# Altium schematic symbol library jlcpcb_2025_04_resistors_extended_1210.schlib: 2670 symbols (part 5 of 14) (continued)
## AC1210FR-07220RL
designator R?  Resistance: 220Ω  (hidden comment: *)
Resistor, 220Ω, ±1%, 500mW, 200V, ±100ppm/℃, -55℃~+155℃, SMD 1210; Manufacturer: Uniroyal; Manufacturer Part Number: AC1210FR-07220RL; Supplier 1: LCSC; Supplier Part Number 1: C230115; JLCPCB Part Number: C230115; Power Rating: 500mW; Category: Resistors; Package Size: 1210; JLCPCB Basic Part: Yes; Tolerance: ±1%; Voltage Rating: 200V; Temperature Coefficient: ±100ppm/℃; Temperature Rating: -55℃~+155℃; ComponentLink1Description: Datasheet; ComponentLink1URL: https://wmsc.lcsc.com/wmsc/upload/file/pdf/v2/lcsc/2304140030_YAGEO-AC1210FR-07220RL_C230115.pdf; ComponentLink2Description: JLCPCB Part URL; ComponentLink2URL: https://jlcpcb.com/partdetail/C230115
pins: 1, 2
1 alternate drawing of the same symbol

## AC1210FR-07221RL
designator R?  Resistance: 221Ω  (hidden comment: *)
Resistor, 221Ω, ±1%, 500mW, 200V, ±100ppm/℃, -55℃~+155℃, SMD 1210; Manufacturer: Uniroyal; Manufacturer Part Number: AC1210FR-07221RL; Supplier 1: LCSC; Supplier Part Number 1: C230116; JLCPCB Part Number: C230116; Power Rating: 500mW; Category: Resistors; Package Size: 1210; JLCPCB Basic Part: Yes; Tolerance: ±1%; Voltage Rating: 200V; Temperature Coefficient: ±100ppm/℃; Temperature Rating: -55℃~+155℃; ComponentLink1Description: Datasheet; ComponentLink1URL: https://wmsc.lcsc.com/wmsc/upload/file/pdf/v2/lcsc/2304140030_YAGEO-AC1210FR-07221RL_C230116.pdf; ComponentLink2Description: JLCPCB Part URL; ComponentLink2URL: https://jlcpcb.com/partdetail/C230116
pins: 1, 2
1 alternate drawing of the same symbol

## AC1210FR-07226RL
designator R?  Resistance: 226Ω  (hidden comment: *)
Resistor, 226Ω, ±1%, 500mW, 200V, ±100ppm/℃, -55℃~+155℃, SMD 1210; Manufacturer: Uniroyal; Manufacturer Part Number: AC1210FR-07226RL; Supplier 1: LCSC; Supplier Part Number 1: C230117; JLCPCB Part Number: C230117; Power Rating: 500mW; Category: Resistors; Package Size: 1210; JLCPCB Basic Part: Yes; Tolerance: ±1%; Voltage Rating: 200V; Temperature Coefficient: ±100ppm/℃; Temperature Rating: -55℃~+155℃; ComponentLink1Description: Datasheet; ComponentLink1URL: https://wmsc.lcsc.com/wmsc/upload/file/pdf/v2/lcsc/2304140030_YAGEO-AC1210FR-07226RL_C230117.pdf; ComponentLink2Description: JLCPCB Part URL; ComponentLink2URL: https://jlcpcb.com/partdetail/C230117
pins: 1, 2
1 alternate drawing of the same symbol

## AC1210FR-07232RL
designator R?  Resistance: 232Ω  (hidden comment: *)
Resistor, 232Ω, ±1%, 500mW, 200V, ±100ppm/℃, -55℃~+155℃, SMD 1210; Manufacturer: Uniroyal; Manufacturer Part Number: AC1210FR-07232RL; Supplier 1: LCSC; Supplier Part Number 1: C230122; JLCPCB Part Number: C230122; Power Rating: 500mW; Category: Resistors; Package Size: 1210; JLCPCB Basic Part: Yes; Tolerance: ±1%; Voltage Rating: 200V; Temperature Coefficient: ±100ppm/℃; Temperature Rating: -55℃~+155℃; ComponentLink1Description: Datasheet; ComponentLink1URL: https://wmsc.lcsc.com/wmsc/upload/file/pdf/v2/lcsc/2304140030_YAGEO-AC1210FR-07232RL_C230122.pdf; ComponentLink2Description: JLCPCB Part URL; ComponentLink2URL: https://jlcpcb.com/partdetail/C230122
pins: 1, 2
1 alternate drawing of the same symbol

## AC1210FR-07237RL
designator R?  Resistance: 237Ω  (hidden comment: *)
Resistor, 237Ω, ±1%, 500mW, 200V, ±100ppm/℃, -55℃~+155℃, SMD 1210; Manufacturer: Uniroyal; Manufacturer Part Number: AC1210FR-07237RL; Supplier 1: LCSC; Supplier Part Number 1: C230123; JLCPCB Part Number: C230123; Power Rating: 500mW; Category: Resistors; Package Size: 1210; JLCPCB Basic Part: Yes; Tolerance: ±1%; Voltage Rating: 200V; Temperature Coefficient: ±100ppm/℃; Temperature Rating: -55℃~+155℃; ComponentLink1Description: Datasheet; ComponentLink1URL: https://wmsc.lcsc.com/wmsc/upload/file/pdf/v2/lcsc/2304140030_YAGEO-AC1210FR-07237RL_C230123.pdf; ComponentLink2Description: JLCPCB Part URL; ComponentLink2URL: https://jlcpcb.com/partdetail/C230123
pins: 1, 2
1 alternate drawing of the same symbol

## AC1210FR-07240KL
designator R?  Resistance: 240kΩ  (hidden comment: *)
Resistor, 240kΩ, ±1%, 500mW, 200V, ±100ppm/℃, -55℃~+155℃, SMD 1210; Manufacturer: Uniroyal; Manufacturer Part Number: AC1210FR-07240KL; Supplier 1: LCSC; Supplier Part Number 1: C230127; JLCPCB Part Number: C230127; Power Rating: 500mW; Category: Resistors; Package Size: 1210; JLCPCB Basic Part: Yes; Tolerance: ±1%; Voltage Rating: 200V; Temperature Coefficient: ±100ppm/℃; Temperature Rating: -55℃~+155℃; ComponentLink1Description: Datasheet; ComponentLink1URL: https://wmsc.lcsc.com/wmsc/upload/file/pdf/v2/lcsc/2304140030_YAGEO-AC1210FR-07240KL_C230127.pdf; ComponentLink2Description: JLCPCB Part URL; ComponentLink2URL: https://jlcpcb.com/partdetail/C230127
pins: 1, 2
1 alternate drawing of the same symbol

## AC1210FR-07240RL
designator R?  Resistance: 240Ω  (hidden comment: *)
Resistor, 240Ω, ±1%, 500mW, 200V, ±100ppm/℃, -55℃~+155℃, SMD 1210; Manufacturer: Uniroyal; Manufacturer Part Number: AC1210FR-07240RL; Supplier 1: LCSC; Supplier Part Number 1: C230128; JLCPCB Part Number: C230128; Power Rating: 500mW; Category: Resistors; Package Size: 1210; JLCPCB Basic Part: Yes; Tolerance: ±1%; Voltage Rating: 200V; Temperature Coefficient: ±100ppm/℃; Temperature Rating: -55℃~+155℃; ComponentLink1Description: Datasheet; ComponentLink1URL: https://wmsc.lcsc.com/wmsc/upload/file/pdf/v2/lcsc/2304140030_YAGEO-AC1210FR-07240RL_C230128.pdf; ComponentLink2Description: JLCPCB Part URL; ComponentLink2URL: https://jlcpcb.com/partdetail/C230128
pins: 1, 2
1 alternate drawing of the same symbol

## AC1210FR-07243RL
designator R?  Resistance: 243Ω  (hidden comment: *)
Resistor, 243Ω, ±1%, 500mW, 200V, ±100ppm/℃, -55℃~+155℃, SMD 1210; Manufacturer: Uniroyal; Manufacturer Part Number: AC1210FR-07243RL; Supplier 1: LCSC; Supplier Part Number 1: C230129; JLCPCB Part Number: C230129; Power Rating: 500mW; Category: Resistors; Package Size: 1210; JLCPCB Basic Part: Yes; Tolerance: ±1%; Voltage Rating: 200V; Temperature Coefficient: ±100ppm/℃; Temperature Rating: -55℃~+155℃; ComponentLink1Description: Datasheet; ComponentLink1URL: https://wmsc.lcsc.com/wmsc/upload/file/pdf/v2/lcsc/2304140030_YAGEO-AC1210FR-07243RL_C230129.pdf; ComponentLink2Description: JLCPCB Part URL; ComponentLink2URL: https://jlcpcb.com/partdetail/C230129
pins: 1, 2
1 alternate drawing of the same symbol

## AC1210FR-07255RL
designator R?  Resistance: 255Ω  (hidden comment: *)
Resistor, 255Ω, ±1%, 500mW, 200V, ±100ppm/℃, -55℃~+155℃, SMD 1210; Manufacturer: Uniroyal; Manufacturer Part Number: AC1210FR-07255RL; Supplier 1: LCSC; Supplier Part Number 1: C230137; JLCPCB Part Number: C230137; Power Rating: 500mW; Category: Resistors; Package Size: 1210; JLCPCB Basic Part: Yes; Tolerance: ±1%; Voltage Rating: 200V; Temperature Coefficient: ±100ppm/℃; Temperature Rating: -55℃~+155℃; ComponentLink1Description: Datasheet; ComponentLink1URL: https://wmsc.lcsc.com/wmsc/upload/file/pdf/v2/lcsc/2304140030_YAGEO-AC1210FR-07255RL_C230137.pdf; ComponentLink2Description: JLCPCB Part URL; ComponentLink2URL: https://jlcpcb.com/partdetail/C230137
pins: 1, 2
1 alternate drawing of the same symbol

## AC1210FR-07267KL
designator R?  Resistance: 267kΩ  (hidden comment: *)
Resistor, 267kΩ, ±1%, 500mW, 200V, ±100ppm/℃, -55℃~+155℃, SMD 1210; Manufacturer: Uniroyal; Manufacturer Part Number: AC1210FR-07267KL; Supplier 1: LCSC; Supplier Part Number 1: C230139; JLCPCB Part Number: C230139; Power Rating: 500mW; Category: Resistors; Package Size: 1210; JLCPCB Basic Part: Yes; Tolerance: ±1%; Voltage Rating: 200V; Temperature Coefficient: ±100ppm/℃; Temperature Rating: -55℃~+155℃; ComponentLink1Description: Datasheet; ComponentLink1URL: https://wmsc.lcsc.com/wmsc/upload/file/pdf/v2/lcsc/2304140030_YAGEO-AC1210FR-07267KL_C230139.pdf; ComponentLink2Description: JLCPCB Part URL; ComponentLink2URL: https://jlcpcb.com/partdetail/C230139
pins: 1, 2
1 alternate drawing of the same symbol

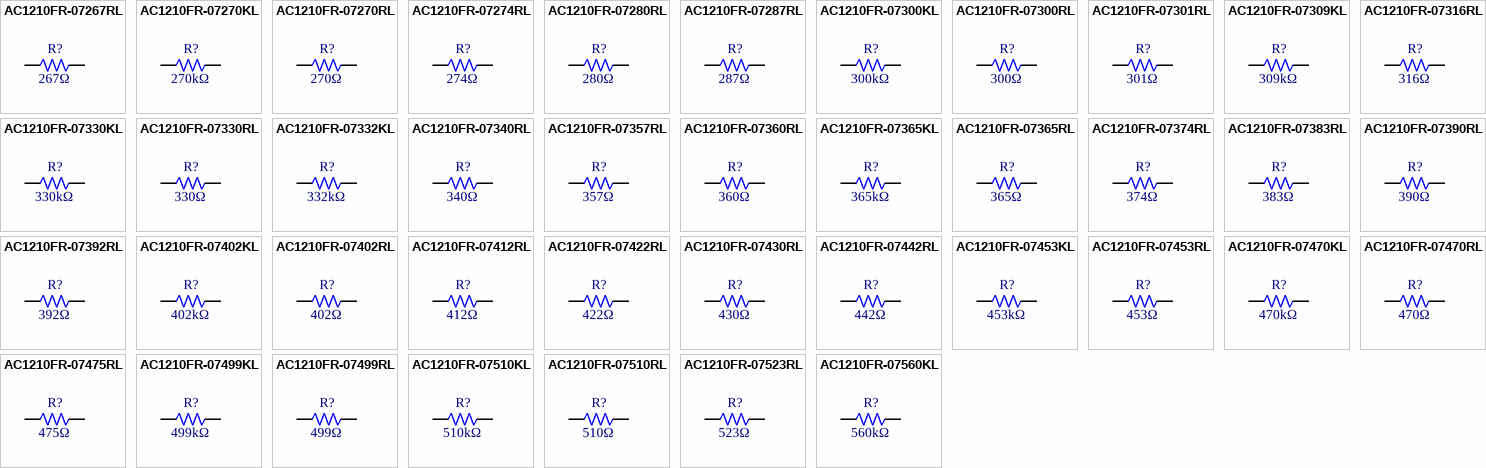
[diagram p22: symbols AC1210FR-07267RL to AC1210FR-07560KL]

## AC1210FR-07267RL
designator R?  Resistance: 267Ω  (hidden comment: *)
Resistor, 267Ω, ±1%, 500mW, 200V, ±100ppm/℃, -55℃~+155℃, SMD 1210; Manufacturer: Uniroyal; Manufacturer Part Number: AC1210FR-07267RL; Supplier 1: LCSC; Supplier Part Number 1: C230140; JLCPCB Part Number: C230140; Power Rating: 500mW; Category: Resistors; Package Size: 1210; JLCPCB Basic Part: Yes; Tolerance: ±1%; Voltage Rating: 200V; Temperature Coefficient: ±100ppm/℃; Temperature Rating: -55℃~+155℃; ComponentLink1Description: Datasheet; ComponentLink1URL: https://wmsc.lcsc.com/wmsc/upload/file/pdf/v2/lcsc/2304140030_YAGEO-AC1210FR-07267RL_C230140.pdf; ComponentLink2Description: JLCPCB Part URL; ComponentLink2URL: https://jlcpcb.com/partdetail/C230140
pins: 1, 2
1 alternate drawing of the same symbol

## AC1210FR-07270KL
designator R?  Resistance: 270kΩ  (hidden comment: *)
Resistor, 270kΩ, ±1%, 500mW, 200V, ±100ppm/℃, -55℃~+155℃, SMD 1210; Manufacturer: Uniroyal; Manufacturer Part Number: AC1210FR-07270KL; Supplier 1: LCSC; Supplier Part Number 1: C230143; JLCPCB Part Number: C230143; Power Rating: 500mW; Category: Resistors; Package Size: 1210; JLCPCB Basic Part: Yes; Tolerance: ±1%; Voltage Rating: 200V; Temperature Coefficient: ±100ppm/℃; Temperature Rating: -55℃~+155℃; ComponentLink1Description: Datasheet; ComponentLink1URL: https://wmsc.lcsc.com/wmsc/upload/file/pdf/v2/lcsc/2304140030_YAGEO-AC1210FR-07270KL_C230143.pdf; ComponentLink2Description: JLCPCB Part URL; ComponentLink2URL: https://jlcpcb.com/partdetail/C230143
pins: 1, 2
1 alternate drawing of the same symbol

## AC1210FR-07270RL
designator R?  Resistance: 270Ω  (hidden comment: *)
Resistor, 270Ω, ±1%, 500mW, 200V, ±100ppm/℃, -55℃~+155℃, SMD 1210; Manufacturer: Uniroyal; Manufacturer Part Number: AC1210FR-07270RL; Supplier 1: LCSC; Supplier Part Number 1: C230144; JLCPCB Part Number: C230144; Power Rating: 500mW; Category: Resistors; Package Size: 1210; JLCPCB Basic Part: Yes; Tolerance: ±1%; Voltage Rating: 200V; Temperature Coefficient: ±100ppm/℃; Temperature Rating: -55℃~+155℃; ComponentLink1Description: Datasheet; ComponentLink1URL: https://wmsc.lcsc.com/wmsc/upload/file/pdf/v2/lcsc/2304140030_YAGEO-AC1210FR-07270RL_C230144.pdf; ComponentLink2Description: JLCPCB Part URL; ComponentLink2URL: https://jlcpcb.com/partdetail/C230144
pins: 1, 2
1 alternate drawing of the same symbol

## AC1210FR-07274RL
designator R?  Resistance: 274Ω  (hidden comment: *)
Resistor, 274Ω, ±1%, 500mW, 200V, ±100ppm/℃, -55℃~+155℃, SMD 1210; Manufacturer: Uniroyal; Manufacturer Part Number: AC1210FR-07274RL; Supplier 1: LCSC; Supplier Part Number 1: C230145; JLCPCB Part Number: C230145; Power Rating: 500mW; Category: Resistors; Package Size: 1210; JLCPCB Basic Part: Yes; Tolerance: ±1%; Voltage Rating: 200V; Temperature Coefficient: ±100ppm/℃; Temperature Rating: -55℃~+155℃; ComponentLink1Description: Datasheet; ComponentLink1URL: https://wmsc.lcsc.com/wmsc/upload/file/pdf/v2/lcsc/2304140030_YAGEO-AC1210FR-07274RL_C230145.pdf; ComponentLink2Description: JLCPCB Part URL; ComponentLink2URL: https://jlcpcb.com/partdetail/C230145
pins: 1, 2
1 alternate drawing of the same symbol

## AC1210FR-07280RL
designator R?  Resistance: 280Ω  (hidden comment: *)
Resistor, 280Ω, ±1%, 500mW, 200V, ±100ppm/℃, -55℃~+155℃, SMD 1210; Manufacturer: Uniroyal; Manufacturer Part Number: AC1210FR-07280RL; Supplier 1: LCSC; Supplier Part Number 1: C230150; JLCPCB Part Number: C230150; Power Rating: 500mW; Category: Resistors; Package Size: 1210; JLCPCB Basic Part: Yes; Tolerance: ±1%; Voltage Rating: 200V; Temperature Coefficient: ±100ppm/℃; Temperature Rating: -55℃~+155℃; ComponentLink1Description: Datasheet; ComponentLink1URL: https://wmsc.lcsc.com/wmsc/upload/file/pdf/v2/lcsc/2304140030_YAGEO-AC1210FR-07280RL_C230150.pdf; ComponentLink2Description: JLCPCB Part URL; ComponentLink2URL: https://jlcpcb.com/partdetail/C230150
pins: 1, 2
1 alternate drawing of the same symbol

## AC1210FR-07287RL
designator R?  Resistance: 287Ω  (hidden comment: *)
Resistor, 287Ω, ±1%, 500mW, 200V, ±100ppm/℃, -55℃~+155℃, SMD 1210; Manufacturer: Uniroyal; Manufacturer Part Number: AC1210FR-07287RL; Supplier 1: LCSC; Supplier Part Number 1: C230151; JLCPCB Part Number: C230151; Power Rating: 500mW; Category: Resistors; Package Size: 1210; JLCPCB Basic Part: Yes; Tolerance: ±1%; Voltage Rating: 200V; Temperature Coefficient: ±100ppm/℃; Temperature Rating: -55℃~+155℃; ComponentLink1Description: Datasheet; ComponentLink1URL: https://wmsc.lcsc.com/wmsc/upload/file/pdf/v2/lcsc/2304140030_YAGEO-AC1210FR-07287RL_C230151.pdf; ComponentLink2Description: JLCPCB Part URL; ComponentLink2URL: https://jlcpcb.com/partdetail/C230151
pins: 1, 2
1 alternate drawing of the same symbol

## AC1210FR-07300KL
designator R?  Resistance: 300kΩ  (hidden comment: *)
Resistor, 300kΩ, ±1%, 500mW, 200V, ±100ppm/℃, -55℃~+155℃, SMD 1210; Manufacturer: Uniroyal; Manufacturer Part Number: AC1210FR-07300KL; Supplier 1: LCSC; Supplier Part Number 1: C230178; JLCPCB Part Number: C230178; Power Rating: 500mW; Category: Resistors; Package Size: 1210; JLCPCB Basic Part: Yes; Tolerance: ±1%; Voltage Rating: 200V; Temperature Coefficient: ±100ppm/℃; Temperature Rating: -55℃~+155℃; ComponentLink1Description: Datasheet; ComponentLink1URL: https://wmsc.lcsc.com/wmsc/upload/file/pdf/v2/lcsc/2304140030_YAGEO-AC1210FR-07300KL_C230178.pdf; ComponentLink2Description: JLCPCB Part URL; ComponentLink2URL: https://jlcpcb.com/partdetail/C230178
pins: 1, 2
1 alternate drawing of the same symbol

## AC1210FR-07300RL
designator R?  Resistance: 300Ω  (hidden comment: *)
Resistor, 300Ω, ±1%, 500mW, 200V, ±100ppm/℃, -55℃~+155℃, SMD 1210; Manufacturer: Uniroyal; Manufacturer Part Number: AC1210FR-07300RL; Supplier 1: LCSC; Supplier Part Number 1: C230179; JLCPCB Part Number: C230179; Power Rating: 500mW; Category: Resistors; Package Size: 1210; JLCPCB Basic Part: Yes; Tolerance: ±1%; Voltage Rating: 200V; Temperature Coefficient: ±100ppm/℃; Temperature Rating: -55℃~+155℃; ComponentLink1Description: Datasheet; ComponentLink1URL: https://wmsc.lcsc.com/wmsc/upload/file/pdf/v2/lcsc/2304140030_YAGEO-AC1210FR-07300RL_C230179.pdf; ComponentLink2Description: JLCPCB Part URL; ComponentLink2URL: https://jlcpcb.com/partdetail/C230179
pins: 1, 2
1 alternate drawing of the same symbol

## AC1210FR-07301RL
designator R?  Resistance: 301Ω  (hidden comment: *)
Resistor, 301Ω, ±1%, 500mW, 200V, ±100ppm/℃, -55℃~+155℃, SMD 1210; Manufacturer: Uniroyal; Manufacturer Part Number: AC1210FR-07301RL; Supplier 1: LCSC; Supplier Part Number 1: C230180; JLCPCB Part Number: C230180; Power Rating: 500mW; Category: Resistors; Package Size: 1210; JLCPCB Basic Part: Yes; Tolerance: ±1%; Voltage Rating: 200V; Temperature Coefficient: ±100ppm/℃; Temperature Rating: -55℃~+155℃; ComponentLink1Description: Datasheet; ComponentLink1URL: https://wmsc.lcsc.com/wmsc/upload/file/pdf/v2/lcsc/2304140030_YAGEO-AC1210FR-07301RL_C230180.pdf; ComponentLink2Description: JLCPCB Part URL; ComponentLink2URL: https://jlcpcb.com/partdetail/C230180
pins: 1, 2
1 alternate drawing of the same symbol

## AC1210FR-07309KL
designator R?  Resistance: 309kΩ  (hidden comment: *)
Resistor, 309kΩ, ±1%, 500mW, 200V, ±100ppm/℃, -55℃~+155℃, SMD 1210; Manufacturer: Uniroyal; Manufacturer Part Number: AC1210FR-07309KL; Supplier 1: LCSC; Supplier Part Number 1: C230181; JLCPCB Part Number: C230181; Power Rating: 500mW; Category: Resistors; Package Size: 1210; JLCPCB Basic Part: Yes; Tolerance: ±1%; Voltage Rating: 200V; Temperature Coefficient: ±100ppm/℃; Temperature Rating: -55℃~+155℃; ComponentLink1Description: Datasheet; ComponentLink1URL: https://wmsc.lcsc.com/wmsc/upload/file/pdf/v2/lcsc/2304140030_YAGEO-AC1210FR-07309KL_C230181.pdf; ComponentLink2Description: JLCPCB Part URL; ComponentLink2URL: https://jlcpcb.com/partdetail/C230181
pins: 1, 2
1 alternate drawing of the same symbol

## AC1210FR-07316RL
designator R?  Resistance: 316Ω  (hidden comment: *)
Resistor, 316Ω, ±1%, 500mW, 200V, ±100ppm/℃, -55℃~+155℃, SMD 1210; Manufacturer: Uniroyal; Manufacturer Part Number: AC1210FR-07316RL; Supplier 1: LCSC; Supplier Part Number 1: C230187; JLCPCB Part Number: C230187; Power Rating: 500mW; Category: Resistors; Package Size: 1210; JLCPCB Basic Part: Yes; Tolerance: ±1%; Voltage Rating: 200V; Temperature Coefficient: ±100ppm/℃; Temperature Rating: -55℃~+155℃; ComponentLink1Description: Datasheet; ComponentLink1URL: https://wmsc.lcsc.com/wmsc/upload/file/pdf/v2/lcsc/2304140030_YAGEO-AC1210FR-07316RL_C230187.pdf; ComponentLink2Description: JLCPCB Part URL; ComponentLink2URL: https://jlcpcb.com/partdetail/C230187
pins: 1, 2
1 alternate drawing of the same symbol

## AC1210FR-07330KL
designator R?  Resistance: 330kΩ  (hidden comment: *)
Resistor, 330kΩ, ±1%, 500mW, 200V, ±100ppm/℃, -55℃~+155℃, SMD 1210; Manufacturer: Uniroyal; Manufacturer Part Number: AC1210FR-07330KL; Supplier 1: LCSC; Supplier Part Number 1: C230192; JLCPCB Part Number: C230192; Power Rating: 500mW; Category: Resistors; Package Size: 1210; JLCPCB Basic Part: Yes; Tolerance: ±1%; Voltage Rating: 200V; Temperature Coefficient: ±100ppm/℃; Temperature Rating: -55℃~+155℃; ComponentLink1Description: Datasheet; ComponentLink1URL: https://wmsc.lcsc.com/wmsc/upload/file/pdf/v2/lcsc/2304140030_YAGEO-AC1210FR-07330KL_C230192.pdf; ComponentLink2Description: JLCPCB Part URL; ComponentLink2URL: https://jlcpcb.com/partdetail/C230192
pins: 1, 2
1 alternate drawing of the same symbol

## AC1210FR-07330RL
designator R?  Resistance: 330Ω  (hidden comment: *)
Resistor, 330Ω, ±1%, 500mW, 200V, ±100ppm/℃, -55℃~+155℃, SMD 1210; Manufacturer: Uniroyal; Manufacturer Part Number: AC1210FR-07330RL; Supplier 1: LCSC; Supplier Part Number 1: C230193; JLCPCB Part Number: C230193; Power Rating: 500mW; Category: Resistors; Package Size: 1210; JLCPCB Basic Part: Yes; Tolerance: ±1%; Voltage Rating: 200V; Temperature Coefficient: ±100ppm/℃; Temperature Rating: -55℃~+155℃; ComponentLink1Description: Datasheet; ComponentLink1URL: https://wmsc.lcsc.com/wmsc/upload/file/pdf/v2/lcsc/2304140030_YAGEO-AC1210FR-07330RL_C230193.pdf; ComponentLink2Description: JLCPCB Part URL; ComponentLink2URL: https://jlcpcb.com/partdetail/C230193
pins: 1, 2
1 alternate drawing of the same symbol

## AC1210FR-07332KL
designator R?  Resistance: 332kΩ  (hidden comment: *)
Resistor, 332kΩ, ±1%, 500mW, 200V, ±100ppm/℃, -55℃~+155℃, SMD 1210; Manufacturer: Uniroyal; Manufacturer Part Number: AC1210FR-07332KL; Supplier 1: LCSC; Supplier Part Number 1: C230194; JLCPCB Part Number: C230194; Power Rating: 500mW; Category: Resistors; Package Size: 1210; JLCPCB Basic Part: Yes; Tolerance: ±1%; Voltage Rating: 200V; Temperature Coefficient: ±100ppm/℃; Temperature Rating: -55℃~+155℃; ComponentLink1Description: Datasheet; ComponentLink1URL: https://wmsc.lcsc.com/wmsc/upload/file/pdf/v2/lcsc/2304140030_YAGEO-AC1210FR-07332KL_C230194.pdf; ComponentLink2Description: JLCPCB Part URL; ComponentLink2URL: https://jlcpcb.com/partdetail/C230194
pins: 1, 2
1 alternate drawing of the same symbol

## AC1210FR-07340RL
designator R?  Resistance: 340Ω  (hidden comment: *)
Resistor, 340Ω, ±1%, 500mW, 200V, ±100ppm/℃, -55℃~+155℃, SMD 1210; Manufacturer: Uniroyal; Manufacturer Part Number: AC1210FR-07340RL; Supplier 1: LCSC; Supplier Part Number 1: C230199; JLCPCB Part Number: C230199; Power Rating: 500mW; Category: Resistors; Package Size: 1210; JLCPCB Basic Part: Yes; Tolerance: ±1%; Voltage Rating: 200V; Temperature Coefficient: ±100ppm/℃; Temperature Rating: -55℃~+155℃; ComponentLink1Description: Datasheet; ComponentLink1URL: https://wmsc.lcsc.com/wmsc/upload/file/pdf/v2/lcsc/2304140030_YAGEO-AC1210FR-07340RL_C230199.pdf; ComponentLink2Description: JLCPCB Part URL; ComponentLink2URL: https://jlcpcb.com/partdetail/C230199
pins: 1, 2
1 alternate drawing of the same symbol

## AC1210FR-07357RL
designator R?  Resistance: 357Ω  (hidden comment: *)
Resistor, 357Ω, ±1%, 500mW, 200V, ±100ppm/℃, -55℃~+155℃, SMD 1210; Manufacturer: Uniroyal; Manufacturer Part Number: AC1210FR-07357RL; Supplier 1: LCSC; Supplier Part Number 1: C230205; JLCPCB Part Number: C230205; Power Rating: 500mW; Category: Resistors; Package Size: 1210; JLCPCB Basic Part: Yes; Tolerance: ±1%; Voltage Rating: 200V; Temperature Coefficient: ±100ppm/℃; Temperature Rating: -55℃~+155℃; ComponentLink1Description: Datasheet; ComponentLink1URL: https://wmsc.lcsc.com/wmsc/upload/file/pdf/v2/lcsc/2304140030_YAGEO-AC1210FR-07357RL_C230205.pdf; ComponentLink2Description: JLCPCB Part URL; ComponentLink2URL: https://jlcpcb.com/partdetail/C230205
pins: 1, 2
1 alternate drawing of the same symbol

## AC1210FR-07360RL
designator R?  Resistance: 360Ω  (hidden comment: *)
Resistor, 360Ω, ±1%, 500mW, 200V, ±100ppm/℃, -55℃~+155℃, SMD 1210; Manufacturer: Uniroyal; Manufacturer Part Number: AC1210FR-07360RL; Supplier 1: LCSC; Supplier Part Number 1: C230208; JLCPCB Part Number: C230208; Power Rating: 500mW; Category: Resistors; Package Size: 1210; JLCPCB Basic Part: Yes; Tolerance: ±1%; Voltage Rating: 200V; Temperature Coefficient: ±100ppm/℃; Temperature Rating: -55℃~+155℃; ComponentLink1Description: Datasheet; ComponentLink1URL: https://wmsc.lcsc.com/wmsc/upload/file/pdf/v2/lcsc/2304140030_YAGEO-AC1210FR-07360RL_C230208.pdf; ComponentLink2Description: JLCPCB Part URL; ComponentLink2URL: https://jlcpcb.com/partdetail/C230208
pins: 1, 2
1 alternate drawing of the same symbol

## AC1210FR-07365KL
designator R?  Resistance: 365kΩ  (hidden comment: *)
Resistor, 365kΩ, ±1%, 500mW, 200V, ±100ppm/℃, -55℃~+155℃, SMD 1210; Manufacturer: Uniroyal; Manufacturer Part Number: AC1210FR-07365KL; Supplier 1: LCSC; Supplier Part Number 1: C230209; JLCPCB Part Number: C230209; Power Rating: 500mW; Category: Resistors; Package Size: 1210; JLCPCB Basic Part: Yes; Tolerance: ±1%; Voltage Rating: 200V; Temperature Coefficient: ±100ppm/℃; Temperature Rating: -55℃~+155℃; ComponentLink1Description: Datasheet; ComponentLink1URL: https://wmsc.lcsc.com/wmsc/upload/file/pdf/v2/lcsc/2304140030_YAGEO-AC1210FR-07365KL_C230209.pdf; ComponentLink2Description: JLCPCB Part URL; ComponentLink2URL: https://jlcpcb.com/partdetail/C230209
pins: 1, 2
1 alternate drawing of the same symbol

## AC1210FR-07365RL
designator R?  Resistance: 365Ω  (hidden comment: *)
Resistor, 365Ω, ±1%, 500mW, 200V, ±100ppm/℃, -55℃~+155℃, SMD 1210; Manufacturer: Uniroyal; Manufacturer Part Number: AC1210FR-07365RL; Supplier 1: LCSC; Supplier Part Number 1: C230210; JLCPCB Part Number: C230210; Power Rating: 500mW; Category: Resistors; Package Size: 1210; JLCPCB Basic Part: Yes; Tolerance: ±1%; Voltage Rating: 200V; Temperature Coefficient: ±100ppm/℃; Temperature Rating: -55℃~+155℃; ComponentLink1Description: Datasheet; ComponentLink1URL: https://wmsc.lcsc.com/wmsc/upload/file/pdf/v2/lcsc/2304140030_YAGEO-AC1210FR-07365RL_C230210.pdf; ComponentLink2Description: JLCPCB Part URL; ComponentLink2URL: https://jlcpcb.com/partdetail/C230210
pins: 1, 2
1 alternate drawing of the same symbol

## AC1210FR-07374RL
designator R?  Resistance: 374Ω  (hidden comment: *)
Resistor, 374Ω, ±1%, 500mW, 200V, ±100ppm/℃, -55℃~+155℃, SMD 1210; Manufacturer: Uniroyal; Manufacturer Part Number: AC1210FR-07374RL; Supplier 1: LCSC; Supplier Part Number 1: C230214; JLCPCB Part Number: C230214; Power Rating: 500mW; Category: Resistors; Package Size: 1210; JLCPCB Basic Part: Yes; Tolerance: ±1%; Voltage Rating: 200V; Temperature Coefficient: ±100ppm/℃; Temperature Rating: -55℃~+155℃; ComponentLink1Description: Datasheet; ComponentLink1URL: https://wmsc.lcsc.com/wmsc/upload/file/pdf/v2/lcsc/2304140030_YAGEO-AC1210FR-07374RL_C230214.pdf; ComponentLink2Description: JLCPCB Part URL; ComponentLink2URL: https://jlcpcb.com/partdetail/C230214
pins: 1, 2
1 alternate drawing of the same symbol

## AC1210FR-07383RL
designator R?  Resistance: 383Ω  (hidden comment: *)
Resistor, 383Ω, ±1%, 500mW, 200V, ±100ppm/℃, -55℃~+155℃, SMD 1210; Manufacturer: Uniroyal; Manufacturer Part Number: AC1210FR-07383RL; Supplier 1: LCSC; Supplier Part Number 1: C230215; JLCPCB Part Number: C230215; Power Rating: 500mW; Category: Resistors; Package Size: 1210; JLCPCB Basic Part: Yes; Tolerance: ±1%; Voltage Rating: 200V; Temperature Coefficient: ±100ppm/℃; Temperature Rating: -55℃~+155℃; ComponentLink1Description: Datasheet; ComponentLink1URL: https://wmsc.lcsc.com/wmsc/upload/file/pdf/v2/lcsc/2304140030_YAGEO-AC1210FR-07383RL_C230215.pdf; ComponentLink2Description: JLCPCB Part URL; ComponentLink2URL: https://jlcpcb.com/partdetail/C230215
pins: 1, 2
1 alternate drawing of the same symbol

## AC1210FR-07390RL
designator R?  Resistance: 390Ω  (hidden comment: *)
Resistor, 390Ω, ±1%, 500mW, 200V, ±100ppm/℃, -55℃~+155℃, SMD 1210; Manufacturer: Uniroyal; Manufacturer Part Number: AC1210FR-07390RL; Supplier 1: LCSC; Supplier Part Number 1: C230219; JLCPCB Part Number: C230219; Power Rating: 500mW; Category: Resistors; Package Size: 1210; JLCPCB Basic Part: Yes; Tolerance: ±1%; Voltage Rating: 200V; Temperature Coefficient: ±100ppm/℃; Temperature Rating: -55℃~+155℃; ComponentLink1Description: Datasheet; ComponentLink1URL: https://wmsc.lcsc.com/wmsc/upload/file/pdf/v2/lcsc/2304140030_YAGEO-AC1210FR-07390RL_C230219.pdf; ComponentLink2Description: JLCPCB Part URL; ComponentLink2URL: https://jlcpcb.com/partdetail/C230219
pins: 1, 2
1 alternate drawing of the same symbol

## AC1210FR-07392RL
designator R?  Resistance: 392Ω  (hidden comment: *)
Resistor, 392Ω, ±1%, 500mW, 200V, ±100ppm/℃, -55℃~+155℃, SMD 1210; Manufacturer: Uniroyal; Manufacturer Part Number: AC1210FR-07392RL; Supplier 1: LCSC; Supplier Part Number 1: C230220; JLCPCB Part Number: C230220; Power Rating: 500mW; Category: Resistors; Package Size: 1210; JLCPCB Basic Part: Yes; Tolerance: ±1%; Voltage Rating: 200V; Temperature Coefficient: ±100ppm/℃; Temperature Rating: -55℃~+155℃; ComponentLink1Description: Datasheet; ComponentLink1URL: https://wmsc.lcsc.com/wmsc/upload/file/pdf/v2/lcsc/2304140030_YAGEO-AC1210FR-07392RL_C230220.pdf; ComponentLink2Description: JLCPCB Part URL; ComponentLink2URL: https://jlcpcb.com/partdetail/C230220
pins: 1, 2
1 alternate drawing of the same symbol

## AC1210FR-07402KL
designator R?  Resistance: 402kΩ  (hidden comment: *)
Resistor, 402kΩ, ±1%, 500mW, 200V, ±100ppm/℃, -55℃~+155℃, SMD 1210; Manufacturer: Uniroyal; Manufacturer Part Number: AC1210FR-07402KL; Supplier 1: LCSC; Supplier Part Number 1: C230236; JLCPCB Part Number: C230236; Power Rating: 500mW; Category: Resistors; Package Size: 1210; JLCPCB Basic Part: Yes; Tolerance: ±1%; Voltage Rating: 200V; Temperature Coefficient: ±100ppm/℃; Temperature Rating: -55℃~+155℃; ComponentLink1Description: Datasheet; ComponentLink1URL: https://wmsc.lcsc.com/wmsc/upload/file/pdf/v2/lcsc/2304140030_YAGEO-AC1210FR-07402KL_C230236.pdf; ComponentLink2Description: JLCPCB Part URL; ComponentLink2URL: https://jlcpcb.com/partdetail/C230236
pins: 1, 2
1 alternate drawing of the same symbol

## AC1210FR-07402RL
designator R?  Resistance: 402Ω  (hidden comment: *)
Resistor, 402Ω, ±1%, 500mW, 200V, ±100ppm/℃, -55℃~+155℃, SMD 1210; Manufacturer: Uniroyal; Manufacturer Part Number: AC1210FR-07402RL; Supplier 1: LCSC; Supplier Part Number 1: C230237; JLCPCB Part Number: C230237; Power Rating: 500mW; Category: Resistors; Package Size: 1210; JLCPCB Basic Part: Yes; Tolerance: ±1%; Voltage Rating: 200V; Temperature Coefficient: ±100ppm/℃; Temperature Rating: -55℃~+155℃; ComponentLink1Description: Datasheet; ComponentLink1URL: https://wmsc.lcsc.com/wmsc/upload/file/pdf/v2/lcsc/2304140030_YAGEO-AC1210FR-07402RL_C230237.pdf; ComponentLink2Description: JLCPCB Part URL; ComponentLink2URL: https://jlcpcb.com/partdetail/C230237
pins: 1, 2
1 alternate drawing of the same symbol

## AC1210FR-07412RL
designator R?  Resistance: 412Ω  (hidden comment: *)
Resistor, 412Ω, ±1%, 500mW, 200V, ±100ppm/℃, -55℃~+155℃, SMD 1210; Manufacturer: Uniroyal; Manufacturer Part Number: AC1210FR-07412RL; Supplier 1: LCSC; Supplier Part Number 1: C230239; JLCPCB Part Number: C230239; Power Rating: 500mW; Category: Resistors; Package Size: 1210; JLCPCB Basic Part: Yes; Tolerance: ±1%; Voltage Rating: 200V; Temperature Coefficient: ±100ppm/℃; Temperature Rating: -55℃~+155℃; ComponentLink1Description: Datasheet; ComponentLink1URL: https://wmsc.lcsc.com/wmsc/upload/file/pdf/v2/lcsc/2304140030_YAGEO-AC1210FR-07412RL_C230239.pdf; ComponentLink2Description: JLCPCB Part URL; ComponentLink2URL: https://jlcpcb.com/partdetail/C230239
pins: 1, 2
1 alternate drawing of the same symbol

## AC1210FR-07422RL
designator R?  Resistance: 422Ω  (hidden comment: *)
Resistor, 422Ω, ±1%, 500mW, 200V, ±100ppm/℃, -55℃~+155℃, SMD 1210; Manufacturer: Uniroyal; Manufacturer Part Number: AC1210FR-07422RL; Supplier 1: LCSC; Supplier Part Number 1: C230240; JLCPCB Part Number: C230240; Power Rating: 500mW; Category: Resistors; Package Size: 1210; JLCPCB Basic Part: Yes; Tolerance: ±1%; Voltage Rating: 200V; Temperature Coefficient: ±100ppm/℃; Temperature Rating: -55℃~+155℃; ComponentLink1Description: Datasheet; ComponentLink1URL: https://wmsc.lcsc.com/wmsc/upload/file/pdf/v2/lcsc/2304140030_YAGEO-AC1210FR-07422RL_C230240.pdf; ComponentLink2Description: JLCPCB Part URL; ComponentLink2URL: https://jlcpcb.com/partdetail/C230240
pins: 1, 2
1 alternate drawing of the same symbol

## AC1210FR-07430RL
designator R?  Resistance: 430Ω  (hidden comment: *)
Resistor, 430Ω, ±1%, 500mW, 200V, ±100ppm/℃, -55℃~+155℃, SMD 1210; Manufacturer: Uniroyal; Manufacturer Part Number: AC1210FR-07430RL; Supplier 1: LCSC; Supplier Part Number 1: C230243; JLCPCB Part Number: C230243; Power Rating: 500mW; Category: Resistors; Package Size: 1210; JLCPCB Basic Part: Yes; Tolerance: ±1%; Voltage Rating: 200V; Temperature Coefficient: ±100ppm/℃; Temperature Rating: -55℃~+155℃; ComponentLink1Description: Datasheet; ComponentLink1URL: https://wmsc.lcsc.com/wmsc/upload/file/pdf/v2/lcsc/2304140030_YAGEO-AC1210FR-07430RL_C230243.pdf; ComponentLink2Description: JLCPCB Part URL; ComponentLink2URL: https://jlcpcb.com/partdetail/C230243
pins: 1, 2
1 alternate drawing of the same symbol

## AC1210FR-07442RL
designator R?  Resistance: 442Ω  (hidden comment: *)
Resistor, 442Ω, ±1%, 500mW, 200V, ±100ppm/℃, -55℃~+155℃, SMD 1210; Manufacturer: Uniroyal; Manufacturer Part Number: AC1210FR-07442RL; Supplier 1: LCSC; Supplier Part Number 1: C230247; JLCPCB Part Number: C230247; Power Rating: 500mW; Category: Resistors; Package Size: 1210; JLCPCB Basic Part: Yes; Tolerance: ±1%; Voltage Rating: 200V; Temperature Coefficient: ±100ppm/℃; Temperature Rating: -55℃~+155℃; ComponentLink1Description: Datasheet; ComponentLink1URL: https://wmsc.lcsc.com/wmsc/upload/file/pdf/v2/lcsc/2304140030_YAGEO-AC1210FR-07442RL_C230247.pdf; ComponentLink2Description: JLCPCB Part URL; ComponentLink2URL: https://jlcpcb.com/partdetail/C230247
pins: 1, 2
1 alternate drawing of the same symbol

## AC1210FR-07453KL
designator R?  Resistance: 453kΩ  (hidden comment: *)
Resistor, 453kΩ, ±1%, 500mW, 200V, ±100ppm/℃, -55℃~+155℃, SMD 1210; Manufacturer: Uniroyal; Manufacturer Part Number: AC1210FR-07453KL; Supplier 1: LCSC; Supplier Part Number 1: C230248; JLCPCB Part Number: C230248; Power Rating: 500mW; Category: Resistors; Package Size: 1210; JLCPCB Basic Part: Yes; Tolerance: ±1%; Voltage Rating: 200V; Temperature Coefficient: ±100ppm/℃; Temperature Rating: -55℃~+155℃; ComponentLink1Description: Datasheet; ComponentLink1URL: https://wmsc.lcsc.com/wmsc/upload/file/pdf/v2/lcsc/2304140030_YAGEO-AC1210FR-07453KL_C230248.pdf; ComponentLink2Description: JLCPCB Part URL; ComponentLink2URL: https://jlcpcb.com/partdetail/C230248
pins: 1, 2
1 alternate drawing of the same symbol

## AC1210FR-07453RL
designator R?  Resistance: 453Ω  (hidden comment: *)
Resistor, 453Ω, ±1%, 500mW, 200V, ±100ppm/℃, -55℃~+155℃, SMD 1210; Manufacturer: Uniroyal; Manufacturer Part Number: AC1210FR-07453RL; Supplier 1: LCSC; Supplier Part Number 1: C230249; JLCPCB Part Number: C230249; Power Rating: 500mW; Category: Resistors; Package Size: 1210; JLCPCB Basic Part: Yes; Tolerance: ±1%; Voltage Rating: 200V; Temperature Coefficient: ±100ppm/℃; Temperature Rating: -55℃~+155℃; ComponentLink1Description: Datasheet; ComponentLink1URL: https://wmsc.lcsc.com/wmsc/upload/file/pdf/v2/lcsc/2304140030_YAGEO-AC1210FR-07453RL_C230249.pdf; ComponentLink2Description: JLCPCB Part URL; ComponentLink2URL: https://jlcpcb.com/partdetail/C230249
pins: 1, 2
1 alternate drawing of the same symbol

## AC1210FR-07470KL
designator R?  Resistance: 470kΩ  (hidden comment: *)
Resistor, 470kΩ, ±1%, 500mW, 200V, ±100ppm/℃, -55℃~+155℃, SMD 1210; Manufacturer: Uniroyal; Manufacturer Part Number: AC1210FR-07470KL; Supplier 1: LCSC; Supplier Part Number 1: C230252; JLCPCB Part Number: C230252; Power Rating: 500mW; Category: Resistors; Package Size: 1210; JLCPCB Basic Part: Yes; Tolerance: ±1%; Voltage Rating: 200V; Temperature Coefficient: ±100ppm/℃; Temperature Rating: -55℃~+155℃; ComponentLink1Description: Datasheet; ComponentLink1URL: https://wmsc.lcsc.com/wmsc/upload/file/pdf/v2/lcsc/2304140030_YAGEO-AC1210FR-07470KL_C230252.pdf; ComponentLink2Description: JLCPCB Part URL; ComponentLink2URL: https://jlcpcb.com/partdetail/C230252
pins: 1, 2
1 alternate drawing of the same symbol

## AC1210FR-07470RL
designator R?  Resistance: 470Ω  (hidden comment: *)
Resistor, 470Ω, ±1%, 500mW, 200V, ±100ppm/℃, -55℃~+155℃, SMD 1210; Manufacturer: Uniroyal; Manufacturer Part Number: AC1210FR-07470RL; Supplier 1: LCSC; Supplier Part Number 1: C230253; JLCPCB Part Number: C230253; Power Rating: 500mW; Category: Resistors; Package Size: 1210; JLCPCB Basic Part: Yes; Tolerance: ±1%; Voltage Rating: 200V; Temperature Coefficient: ±100ppm/℃; Temperature Rating: -55℃~+155℃; ComponentLink1Description: Datasheet; ComponentLink1URL: https://wmsc.lcsc.com/wmsc/upload/file/pdf/v2/lcsc/2304140030_YAGEO-AC1210FR-07470RL_C230253.pdf; ComponentLink2Description: JLCPCB Part URL; ComponentLink2URL: https://jlcpcb.com/partdetail/C230253
pins: 1, 2
1 alternate drawing of the same symbol

## AC1210FR-07475RL
designator R?  Resistance: 475Ω  (hidden comment: *)
Resistor, 475Ω, ±1%, 500mW, 200V, ±100ppm/℃, -55℃~+155℃, SMD 1210; Manufacturer: Uniroyal; Manufacturer Part Number: AC1210FR-07475RL; Supplier 1: LCSC; Supplier Part Number 1: C230254; JLCPCB Part Number: C230254; Power Rating: 500mW; Category: Resistors; Package Size: 1210; JLCPCB Basic Part: Yes; Tolerance: ±1%; Voltage Rating: 200V; Temperature Coefficient: ±100ppm/℃; Temperature Rating: -55℃~+155℃; ComponentLink1Description: Datasheet; ComponentLink1URL: https://wmsc.lcsc.com/wmsc/upload/file/pdf/v2/lcsc/2304140030_YAGEO-AC1210FR-07475RL_C230254.pdf; ComponentLink2Description: JLCPCB Part URL; ComponentLink2URL: https://jlcpcb.com/partdetail/C230254
pins: 1, 2
1 alternate drawing of the same symbol

## AC1210FR-07499KL
designator R?  Resistance: 499kΩ  (hidden comment: *)
Resistor, 499kΩ, ±1%, 500mW, 200V, ±100ppm/℃, -55℃~+155℃, SMD 1210; Manufacturer: Uniroyal; Manufacturer Part Number: AC1210FR-07499KL; Supplier 1: LCSC; Supplier Part Number 1: C230258; JLCPCB Part Number: C230258; Power Rating: 500mW; Category: Resistors; Package Size: 1210; JLCPCB Basic Part: Yes; Tolerance: ±1%; Voltage Rating: 200V; Temperature Coefficient: ±100ppm/℃; Temperature Rating: -55℃~+155℃; ComponentLink1Description: Datasheet; ComponentLink1URL: https://wmsc.lcsc.com/wmsc/upload/file/pdf/v2/lcsc/2304140030_YAGEO-AC1210FR-07499KL_C230258.pdf; ComponentLink2Description: JLCPCB Part URL; ComponentLink2URL: https://jlcpcb.com/partdetail/C230258
pins: 1, 2
1 alternate drawing of the same symbol

## AC1210FR-07499RL
designator R?  Resistance: 499Ω  (hidden comment: *)
Resistor, 499Ω, ±1%, 500mW, 200V, ±100ppm/℃, -55℃~+155℃, SMD 1210; Manufacturer: Uniroyal; Manufacturer Part Number: AC1210FR-07499RL; Supplier 1: LCSC; Supplier Part Number 1: C230259; JLCPCB Part Number: C230259; Power Rating: 500mW; Category: Resistors; Package Size: 1210; JLCPCB Basic Part: Yes; Tolerance: ±1%; Voltage Rating: 200V; Temperature Coefficient: ±100ppm/℃; Temperature Rating: -55℃~+155℃; ComponentLink1Description: Datasheet; ComponentLink1URL: https://wmsc.lcsc.com/wmsc/upload/file/pdf/v2/lcsc/2304140030_YAGEO-AC1210FR-07499RL_C230259.pdf; ComponentLink2Description: JLCPCB Part URL; ComponentLink2URL: https://jlcpcb.com/partdetail/C230259
pins: 1, 2
1 alternate drawing of the same symbol

## AC1210FR-07510KL
designator R?  Resistance: 510kΩ  (hidden comment: *)
Resistor, 510kΩ, ±1%, 500mW, 200V, ±100ppm/℃, -55℃~+155℃, SMD 1210; Manufacturer: Uniroyal; Manufacturer Part Number: AC1210FR-07510KL; Supplier 1: LCSC; Supplier Part Number 1: C230276; JLCPCB Part Number: C230276; Power Rating: 500mW; Category: Resistors; Package Size: 1210; JLCPCB Basic Part: Yes; Tolerance: ±1%; Voltage Rating: 200V; Temperature Coefficient: ±100ppm/℃; Temperature Rating: -55℃~+155℃; ComponentLink1Description: Datasheet; ComponentLink1URL: https://wmsc.lcsc.com/wmsc/upload/file/pdf/v2/lcsc/2304140030_YAGEO-AC1210FR-07510KL_C230276.pdf; ComponentLink2Description: JLCPCB Part URL; ComponentLink2URL: https://jlcpcb.com/partdetail/C230276
pins: 1, 2
1 alternate drawing of the same symbol

## AC1210FR-07510RL
designator R?  Resistance: 510Ω  (hidden comment: *)
Resistor, 510Ω, ±1%, 500mW, 200V, ±100ppm/℃, -55℃~+155℃, SMD 1210; Manufacturer: Uniroyal; Manufacturer Part Number: AC1210FR-07510RL; Supplier 1: LCSC; Supplier Part Number 1: C230277; JLCPCB Part Number: C230277; Power Rating: 500mW; Category: Resistors; Package Size: 1210; JLCPCB Basic Part: Yes; Tolerance: ±1%; Voltage Rating: 200V; Temperature Coefficient: ±100ppm/℃; Temperature Rating: -55℃~+155℃; ComponentLink1Description: Datasheet; ComponentLink1URL: https://wmsc.lcsc.com/wmsc/upload/file/pdf/v2/lcsc/2304140030_YAGEO-AC1210FR-07510RL_C230277.pdf; ComponentLink2Description: JLCPCB Part URL; ComponentLink2URL: https://jlcpcb.com/partdetail/C230277
pins: 1, 2
1 alternate drawing of the same symbol

## AC1210FR-07523RL
designator R?  Resistance: 523Ω  (hidden comment: *)
Resistor, 523Ω, ±1%, 500mW, 200V, ±100ppm/℃, -55℃~+155℃, SMD 1210; Manufacturer: Uniroyal; Manufacturer Part Number: AC1210FR-07523RL; Supplier 1: LCSC; Supplier Part Number 1: C910158; JLCPCB Part Number: C910158; Power Rating: 500mW; Category: Resistors; Package Size: 1210; JLCPCB Basic Part: Yes; Tolerance: ±1%; Voltage Rating: 200V; Temperature Coefficient: ±100ppm/℃; Temperature Rating: -55℃~+155℃; ComponentLink1Description: Datasheet; ComponentLink1URL: https://wmsc.lcsc.com/wmsc/upload/file/pdf/v2/lcsc/2201242100_YAGEO-AC1210FR-07523RL_C910158.pdf; ComponentLink2Description: JLCPCB Part URL; ComponentLink2URL: https://jlcpcb.com/partdetail/C910158
pins: 1, 2
1 alternate drawing of the same symbol
